# Altium footprint library ref-packages-longpad.PCBLIB: 1527 footprints (part 61 of 103)
Each footprint in its own frame and in the unit in brackets; x right, y up, seen from the top. Pads: shape width x height; smd on the part's side, far side on the other; paste and mask are expansions set on the pad; w line width, h text height; cw(c..) or ccw(c..) is an arc to the next point about the centre after c.
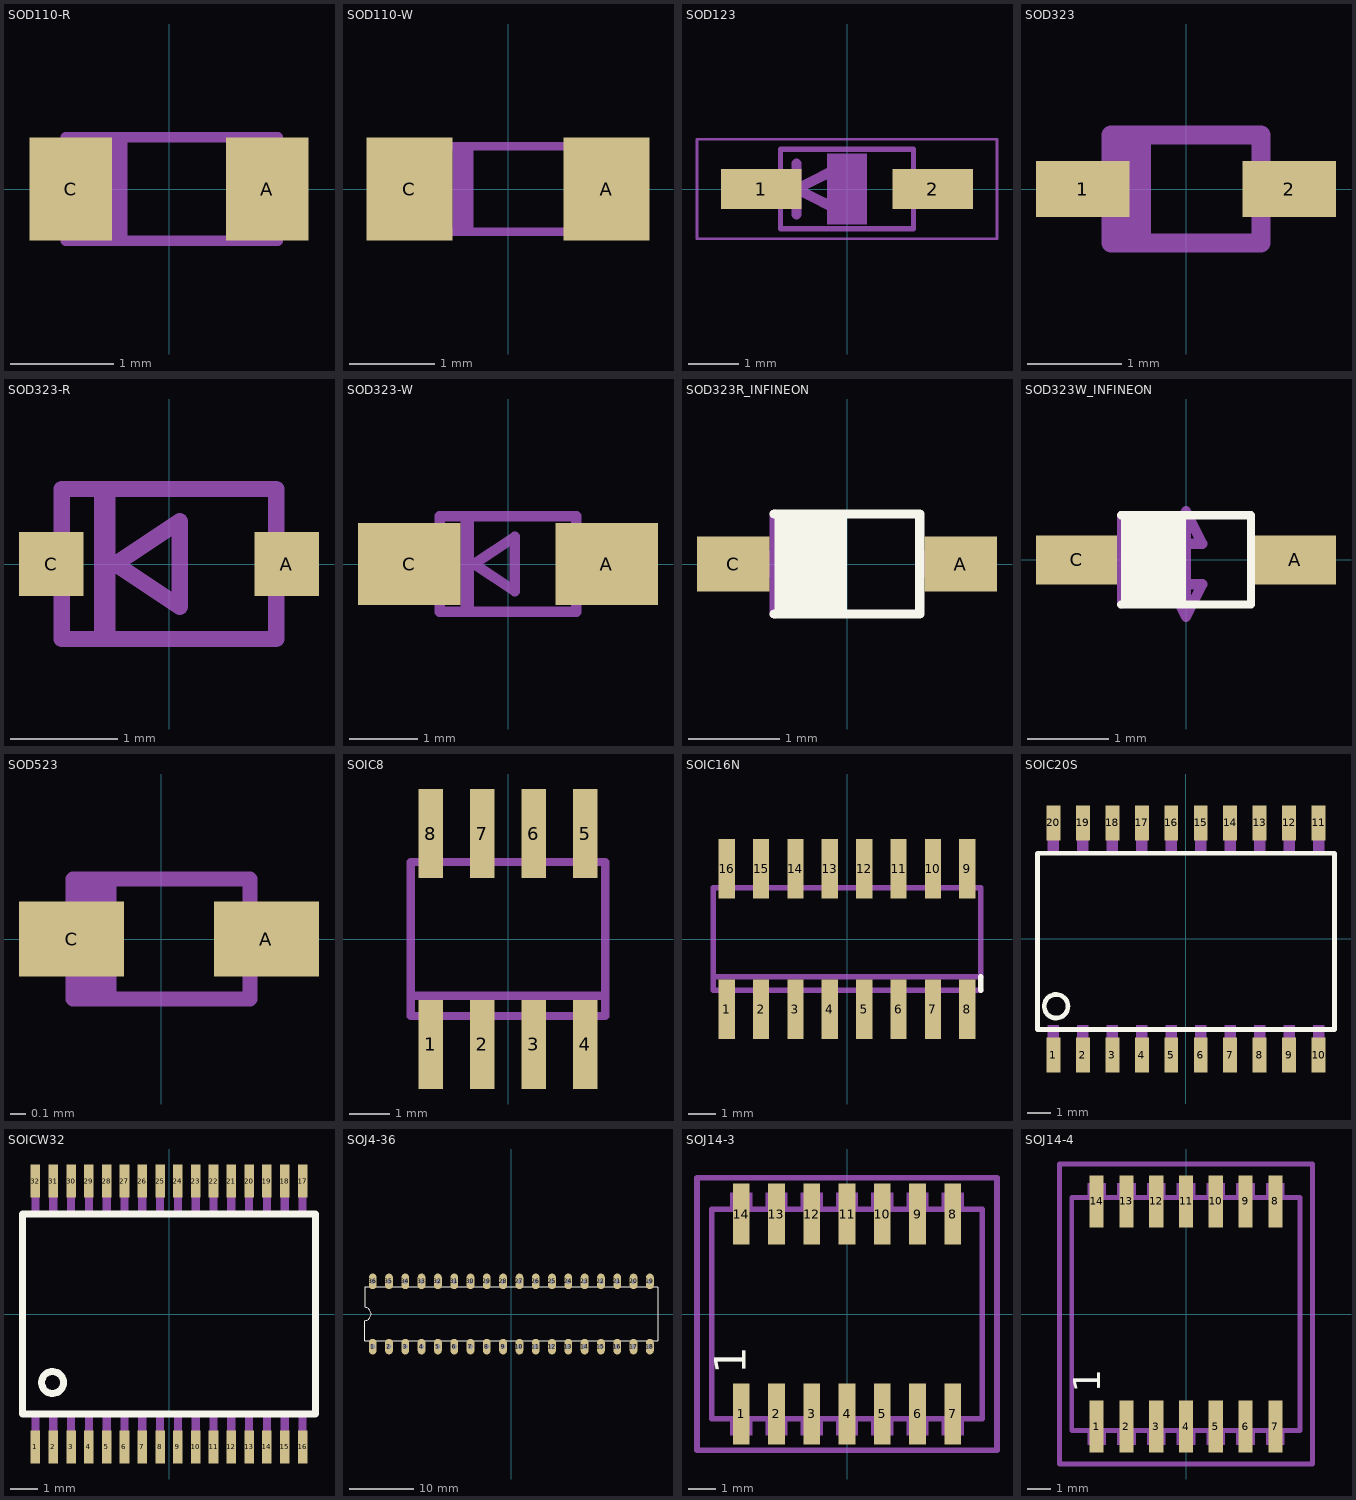
[diagram p60: the footprints below, top view; thin cyan lines are the x and y axes]

## SOD110-R [mil]
pads (2):
  rect 31.5x39.37 smd: A(37.4,0) C(-37.4,0)
Mechanical 16:
  rectangle: -25.59,-17.72 -15.75,17.72
  lines w4: -39.37,-19.69 41.34,-19.69 41.34,19.69 -39.37,19.69 -39.37,-19.69

## SOD110-W [mm]
pads (2):
  rect 1x1.2 smd: A(1.15,0) C(-1.15,0)
Mechanical 16:
  rectangle: -0.65,-0.45 -0.4,0.45
  lines w0.102: -1,-0.5 1.05,-0.5 1.05,0.5 -1,0.5 -1,-0.5

## SOD123 [mil]
pads (2):
  rect 62.99x31.5 smd: 1(-66.93,0) 2(66.93,0)
Mechanical 6:
  rectangle: -15.75,-27.56 15.75,27.56
Mechanical 16:
  rectangle: -77,-12 -54,12
  rectangle: 54,-12 77,12
  lines w4: -52.01,-30.98 52.01,-30.98 52.01,30.98 -52.01,30.98 -52.01,-30.98
  lines w8: -39.37,-19.69 -39.37,0 ; -39.37,19.69 -39.37,0 ; -39.37,0 0,19.69 0,-19.69 -39.37,0
Mechanical 27:
  lines w2: -117.05,-38.7 117.05,-38.7 117.05,38.7 -117.05,38.7 -117.05,-38.7

## SOD323 [mm]
pads (2):
  rect 1x0.6 smd: 1(-1.1,0) 2(1.1,0)
Mechanical 16:
  rectangle: -1.35,-0.2 -0.9,0.2
  rectangle: 0.9,-0.2 1.35,0.2
  rectangle: -0.75,-0.575 -0.375,0.575
  lines w0.203: -0.8,-0.575 0.8,-0.575 0.8,0.575 -0.8,0.575 -0.8,-0.575

## SOD323-R [mil]
pads (2):
  rect 23.62x23.62 smd: A(43.31,0) C(-43.31,0)
Mechanical 16:
  rectangle: -27.56,-27.56 -19.69,27.56
  lines w6: -39.37,-27.56 39.37,-27.56 39.37,27.56 -39.37,27.56 -39.37,-27.56 ; -19.69,0 3.94,15.75 3.94,-15.75 -19.69,0

## SOD323-W [mil]
pads (2):
  rect 59.06x47.24 smd: A(57.09,0) C(-57.09,0)
Mechanical 16:
  rectangle: -27.56,-27.56 -19.69,27.56
  lines w6: -39.37,-27.56 39.37,-27.56 39.37,27.56 -39.37,27.56 -39.37,-27.56 ; -19.69,0 3.94,15.75 3.94,-15.75 -19.69,0

## SOD323R_INFINEON [mil]
pads (2):
  rect 31.5x23.62 smd: A(49.21,0) C(-49.21,0)
Top Overlay:
  rectangle: -31.5,-21.65 0,21.65
  lines w4: -31.5,-21.65 31.5,-21.65 31.5,21.65 -31.5,21.65
Mechanical 16:
  rectangle: -49.21,-5.91 -31.5,5.91
  rectangle: 31.5,-5.91 49.21,5.91
  lines w4: -31.5,-21.65 -31.5,21.65

## SOD323W_INFINEON [mm]
pads (2):
  rect 1x0.6 smd: A(1.35,0) C(-1.35,0)
Top Overlay:
  rectangle: -0.8,-0.55 0,0.55
  lines w0.102: -0.8,-0.55 0.8,-0.55 0.8,0.55 -0.8,0.55
Mechanical 13:
  lines w0.127: 0,-0.7 0,0.6 ; 0,-0.7 0.2,-0.3 -0.2,-0.3 0,-0.7 ; 0,0.6 -0.2,0.2 0.2,0.2 0,0.6
  text "direction of pcb" at 0.4,0.4 h0.39
  text "transportation for" at 0.4,-0.05 h0.39
  text "wavesoldering" at 0.4,-0.5 h0.39
Mechanical 16:
  rectangle: -1.25,-0.15 -0.8,0.15
  rectangle: 0.8,-0.15 1.25,0.15
  lines w0.102: -0.8,-0.55 -0.8,0.55

## SOD523 [mil]
pads (2):
  rect 27.56x19.69 smd: A(27.56,0) C(-23.62,0)
Mechanical 16:
  rectangle: -29.53,-6.69 -21.26,6.69
  rectangle: 21.26,-6.69 29.53,6.69
  rectangle: -23.23,-15.75 -11.81,15.75
  lines w4: -23.23,-15.75 23.23,-15.75 23.23,15.75 -23.23,15.75 -23.23,-15.75

## SOIC8 [mil]
pads (8):
  rect 23.62x86.61 smd: 1(-75,-102.36) 2(-25,-102.36) 3(25,-102.36) 4(75,-102.36) 5(75,102.36) 6(25,102.36) 7(-25,102.36) 8(-75,102.36)
Mechanical 16:
  rectangle: -84.65,-122.05 -65.35,-78.74
  rectangle: -34.65,-122.05 -15.35,-78.74
  rectangle: 15.35,-122.05 34.65,-78.74
  rectangle: 65.35,-122.05 84.65,-78.74
  rectangle: 65.35,78.74 84.65,122.05
  rectangle: 15.35,78.74 34.65,122.05
  rectangle: -34.65,78.74 -15.35,122.05
  rectangle: -84.65,78.74 -65.35,122.05
  lines w8: -94.49,-55.12 -94.49,-74.8 94.49,-74.8 94.49,-55.12 ; -94.49,-55.12 -94.49,74.8 94.49,74.8 94.49,-55.12 ; -94.49,-55.12 94.49,-55.12

## SOIC16N [mil]
pads (16):
  rect 23.62x86.61 smd: 1(-175,-102.36) 2(-125,-102.36) 3(-75,-102.36) 4(-25,-102.36) 5(25,-102.36) 6(75,-102.36) 7(125,-102.36) 8(175,-102.36) 9(175,102.36) 10(125,102.36) 11(75,102.36) 12(25,102.36) 13(-25,102.36) 14(-75,102.36) 15(-125,102.36) 16(-175,102.36)
Top Overlay:
  lines w8: 194.49,-74.8 194.49,-55.12
Mechanical 16:
  rectangle: -184.65,-122.05 -165.35,-78.74
  rectangle: -134.65,-122.05 -115.35,-78.74
  rectangle: -84.65,-122.05 -65.35,-78.74
  rectangle: -34.65,-122.05 -15.35,-78.74
  rectangle: 65.35,78.74 84.65,122.05
  rectangle: 15.35,78.74 34.65,122.05
  rectangle: -34.65,78.74 -15.35,122.05
  rectangle: -84.65,78.74 -65.35,122.05
  rectangle: 15.35,-122.05 34.65,-78.74
  rectangle: 65.35,-122.05 84.65,-78.74
  rectangle: 115.35,-122.05 134.65,-78.74
  rectangle: 165.35,-122.05 184.65,-78.74
  rectangle: 165.35,78.74 184.65,122.05
  rectangle: 115.35,78.74 134.65,122.05
  rectangle: -134.65,78.74 -115.35,122.05
  rectangle: -184.65,78.74 -165.35,122.05
  lines w8: 194.49,-74.8 -194.49,-74.8 -194.49,-55.12 ; -194.49,-55.12 -194.49,74.8 194.49,74.8 194.49,-55.12 -194.49,-55.12

## SOIC20S [mm]
pads (20):
  rect 0.6x1.5 smd: 1(-5.715,-5) 2(-4.445,-5) 3(-3.175,-5) 4(-1.905,-5) 5(-0.635,-5) 6(0.635,-5) 7(1.905,-5) 8(3.175,-5) 9(4.445,-5) 10(5.715,-5) 11(5.715,5) 12(4.445,5) 13(3.175,5) 14(1.905,5) 15(0.635,5) 16(-0.635,5) 17(-1.905,5) 18(-3.175,5) 19(-4.445,5) 20(-5.715,5)
Top Overlay:
  circle w0.203: c-5.6,-2.9 r0.51
  lines w0.203: -6.4,-3.9 6.4,-3.9 6.4,3.7 -6.4,3.7 -6.4,-3.9
Mechanical 16:
  rectangle: -5.965,-5.3 -5.465,-3.7
  rectangle: -4.695,-5.3 -4.195,-3.7
  rectangle: -3.425,-5.3 -2.925,-3.7
  rectangle: -2.155,-5.3 -1.655,-3.7
  rectangle: -0.885,-5.3 -0.385,-3.7
  rectangle: 0.385,-5.3 0.885,-3.7
  rectangle: 1.655,-5.3 2.155,-3.7
  rectangle: 2.925,-5.3 3.425,-3.7
  rectangle: 4.195,-5.3 4.695,-3.7
  rectangle: 5.465,-5.3 5.965,-3.7
  rectangle: 5.465,3.7 5.965,5.3
  rectangle: 4.195,3.7 4.695,5.3
  rectangle: 2.925,3.7 3.425,5.3
  rectangle: 1.655,3.7 2.155,5.3
  rectangle: 0.385,3.7 0.885,5.3
  rectangle: -0.885,3.7 -0.385,5.3
  rectangle: -2.155,3.7 -1.655,5.3
  rectangle: -3.425,3.7 -2.925,5.3
  rectangle: -4.695,3.7 -4.195,5.3
  rectangle: -5.965,3.7 -5.465,5.3

## SOICW32 [mm]
pads (32):
  rect 0.35x1.2 smd: 1(-4.875,-4.85) 2(-4.225,-4.85) 3(-3.575,-4.85) 4(-2.925,-4.85) 5(-2.275,-4.85) 6(-1.625,-4.85) 7(-0.975,-4.85) 8(-0.325,-4.85) 9(0.325,-4.85) 10(0.975,-4.85) 11(1.625,-4.85) 12(2.275,-4.85) 13(2.925,-4.85) 14(3.575,-4.85) 15(4.225,-4.85) 16(4.875,-4.85) 17(4.875,4.85) 18(4.225,4.85) 19(3.575,4.85) 20(2.925,4.85) 21(2.275,4.85) 22(1.625,4.85) 23(0.975,4.85) 24(0.325,4.85) 25(-0.325,4.85) 26(-0.975,4.85) 27(-1.625,4.85) 28(-2.275,4.85) 29(-2.925,4.85) 30(-3.575,4.85) 31(-4.225,4.85) 32(-4.875,4.85)
Top Overlay:
  circle w0.254: c-4.25,-2.5 r0.4
  lines w0.254: -5.35,-3.65 5.35,-3.65 5.35,3.65 -5.35,3.65 -5.35,-3.65
Mechanical 16:
  rectangle: -5.025,-5.15 -4.725,-3.75
  rectangle: -4.375,-5.15 -4.075,-3.75
  rectangle: -3.725,-5.15 -3.425,-3.75
  rectangle: -3.075,-5.15 -2.775,-3.75
  rectangle: -2.425,-5.15 -2.125,-3.75
  rectangle: -1.775,-5.15 -1.475,-3.75
  rectangle: -1.125,-5.15 -0.825,-3.75
  rectangle: -0.475,-5.15 -0.175,-3.75
  rectangle: 0.175,-5.15 0.475,-3.75
  rectangle: 0.825,-5.15 1.125,-3.75
  rectangle: 1.475,-5.15 1.775,-3.75
  rectangle: 2.125,-5.15 2.425,-3.75
  rectangle: 2.775,-5.15 3.075,-3.75
  rectangle: 3.425,-5.15 3.725,-3.75
  rectangle: 4.075,-5.15 4.375,-3.75
  rectangle: 4.725,-5.15 5.025,-3.75
  rectangle: 4.725,3.75 5.025,5.15
  rectangle: 4.075,3.75 4.375,5.15
  rectangle: 3.425,3.75 3.725,5.15
  rectangle: 2.775,3.75 3.075,5.15
  rectangle: 2.125,3.75 2.425,5.15
  rectangle: 1.475,3.75 1.775,5.15
  rectangle: 0.825,3.75 1.125,5.15
  rectangle: 0.175,3.75 0.475,5.15
  rectangle: -0.475,3.75 -0.175,5.15
  rectangle: -1.125,3.75 -0.825,5.15
  rectangle: -1.775,3.75 -1.475,5.15
  rectangle: -2.425,3.75 -2.125,5.15
  rectangle: -3.075,3.75 -2.775,5.15
  rectangle: -3.725,3.75 -3.425,5.15
  rectangle: -4.375,3.75 -4.075,5.15
  rectangle: -5.025,3.75 -4.725,5.15

## SOJ4-36 [mil]
pads (36):
  oval 48x96 hole 32: 1(-850,-200) 2(-750,-200) 3(-650,-200) 4(-550,-200) 5(-450,-200) 6(-350,-200) 7(-250,-200) 8(-150,-200) 9(-50,-200) 10(50,-200) 11(150,-200) 12(250,-200) 13(350,-200) 14(450,-200) 15(550,-200) 16(650,-200) 17(750,-200) 18(850,-200) 19(850,200) 20(750,200) 21(650,200) 22(550,200) 23(450,200) 24(350,200) 25(250,200) 26(150,200) 27(50,200) 28(-50,200) 29(-150,200) 30(-250,200) 31(-350,200) 32(-450,200) 33(-550,200) 34(-650,200) 35(-750,200) 36(-850,200)
Top Overlay:
  lines w6: -900,-165 900,-165 900,165 -900,165 -900,40 cw(c-900,0) -900,-40 -900,-165

## SOJ14-3 [mil]
pads (14):
  rect 23.62x86.61 smd: 1(-150,-141.73) 2(-100,-141.73) 3(-50,-141.73) 4(0,-141.73) 5(50,-141.73) 6(100,-141.73) 7(150,-141.73) 8(150,141.73) 9(100,141.73) 10(50,141.73) 11(0,141.73) 12(-50,141.73) 13(-100,141.73) 14(-150,141.73)
Top Overlay:
  text "1" at -128.54,-85.43 h77.5
Mechanical 16:
  rectangle: -159.84,-144.49 -140.16,-99.61
  rectangle: -165.75,-172.44 -134.25,-152.36
  rectangle: -109.84,-144.49 -90.16,-99.61
  rectangle: -115.75,-172.44 -84.25,-152.36
  rectangle: -59.84,-144.49 -40.16,-99.61
  rectangle: -65.75,-172.44 -34.25,-152.36
  rectangle: -9.84,-144.49 9.84,-99.61
  rectangle: -15.75,-172.44 15.75,-152.36
  rectangle: 40.16,-144.49 59.84,-99.61
  rectangle: 34.25,-172.44 65.75,-152.36
  rectangle: 90.16,-144.49 109.84,-99.61
  rectangle: 84.25,-172.44 115.75,-152.36
  rectangle: 140.16,-144.49 159.84,-99.61
  rectangle: 134.25,-172.44 165.75,-152.36
  rectangle: 140.16,99.61 159.84,144.49
  rectangle: 134.25,152.36 165.75,172.44
  rectangle: 90.16,99.61 109.84,144.49
  rectangle: 84.25,152.36 115.75,172.44
  rectangle: 40.16,99.61 59.84,144.49
  rectangle: 34.25,152.36 65.75,172.44
  rectangle: -9.84,99.61 9.84,144.49
  rectangle: -15.75,152.36 15.75,172.44
  rectangle: -59.84,99.61 -40.16,144.49
  rectangle: -65.75,152.36 -34.25,172.44
  rectangle: -109.84,99.61 -90.16,144.49
  rectangle: -115.75,152.36 -84.25,172.44
  rectangle: -159.84,99.61 -140.16,144.49
  rectangle: -165.75,152.36 -134.25,172.44
  lines w8: -191.93,-148.43 191.54,-148.43 191.54,148.43 -191.93,148.43 -191.93,-148.43
Mechanical 27:
  lines w7.87: -212.6,-192.91 -212.6,192.91 212.6,192.91 212.6,-192.91 -212.6,-192.91

## SOJ14-4 [mil]
pads (14):
  rect 23.62x86.61 smd: 1(-150,-188.98) 2(-100,-188.98) 3(-50,-188.98) 4(0,-188.98) 5(50,-188.98) 6(100,-188.98) 7(150,-188.98) 8(150,188.98) 9(100,188.98) 10(50,188.98) 11(0,188.98) 12(-50,188.98) 13(-100,188.98) 14(-150,188.98)
Top Overlay:
  text "1" at -128.54,-132.68 h77.5
Mechanical 16:
  rectangle: -159.84,-191.73 -140.16,-146.85
  rectangle: -165.75,-219.69 -134.25,-199.61
  rectangle: -109.84,-191.73 -90.16,-146.85
  rectangle: -115.75,-219.69 -84.25,-199.61
  rectangle: -59.84,-191.73 -40.16,-146.85
  rectangle: -65.75,-219.69 -34.25,-199.61
  rectangle: -9.84,-191.73 9.84,-146.85
  rectangle: -15.75,-219.69 15.75,-199.61
  rectangle: 40.16,-191.73 59.84,-146.85
  rectangle: 34.25,-219.69 65.75,-199.61
  rectangle: 90.16,-191.73 109.84,-146.85
  rectangle: 84.25,-219.69 115.75,-199.61
  rectangle: 140.16,-191.73 159.84,-146.85
  rectangle: 134.25,-219.69 165.75,-199.61
  rectangle: 140.16,146.85 159.84,191.73
  rectangle: 134.25,199.61 165.75,219.69
  rectangle: 90.16,146.85 109.84,191.73
  rectangle: 84.25,199.61 115.75,219.69
  rectangle: 40.16,146.85 59.84,191.73
  rectangle: 34.25,199.61 65.75,219.69
  rectangle: -9.84,146.85 9.84,191.73
  rectangle: -15.75,199.61 15.75,219.69
  rectangle: -59.84,146.85 -40.16,191.73
  rectangle: -65.75,199.61 -34.25,219.69
  rectangle: -109.84,146.85 -90.16,191.73
  rectangle: -115.75,199.61 -84.25,219.69
  rectangle: -159.84,146.85 -140.16,191.73
  rectangle: -165.75,199.61 -134.25,219.69
  lines w8: -191.93,-195.67 191.54,-195.67 191.54,195.67 -191.93,195.67 -191.93,-195.67
Mechanical 27:
  lines w7.87: -212.6,-251.97 -212.6,251.97 212.6,251.97 212.6,-251.97 -212.6,-251.97